# Altium schematic symbol library jlcpcb_2025_04_inductors_extended_0603.schlib: 1269 symbols (part 7 of 7)
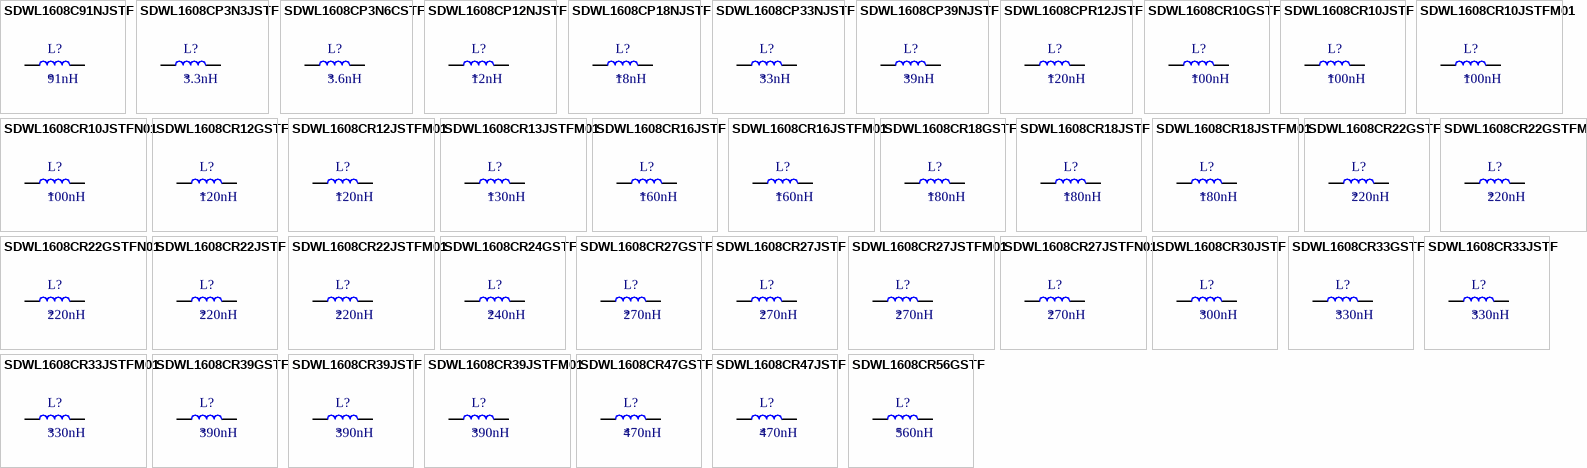
[diagram p37: symbols SDWL1608C91NJSTF to SDWL1608CR56GSTF]

## SDWL1608CR18JSTF
designator L?  Inductance: 180nH
Inductor, 180nH, ±5%, 1.38Ω, 180mA, SMD 0603; Manufacturer: Sunlord; Manufacturer Part Number: SDWL1608CR18JSTF; Package Size: 0603; JLCPCB Basic Part: No; JLCPCB Part Number: C334269; Supplier 1: LCSC; Category: Inductors; Supplier Part Number 1: C334269; Tolerance: ±5%; Rated Current: 180mA; DC Resistance: 1.38Ω; RoHS: Yes; ComponentLink1Description: Datasheet; ComponentLink1URL: https://wmsc.lcsc.com/wmsc/upload/file/pdf/v2/lcsc/2110081430_Sunlord-SDWL1608CR18JSTF_C334269.pdf; ComponentLink2Description: JLCPCB Part URL; ComponentLink2URL: https://jlcpcb.com/partdetail/C334269; ComponentLink3Description: LCSC Part URL; ComponentLink3URL: https://lcsc.com/product-detail/Inductors-SMD_Sunlord-Sunlord-SDWL1608CR18JSTF_C334269.html
footprint IND-0603 (0603 (1608M) Inductor)
pins: 1, 2

## SDWL1608CR18JSTFM01
designator L?  Inductance: 180nH
Inductor, 180nH, ±5%, 2.2Ω, 140mA, SMD 0603; Manufacturer: Sunlord; Manufacturer Part Number: SDWL1608CR18JSTFM01; Self-Resonant Frequency: 100MHz; Q Factor: 25@100MHz; Package Size: 0603; JLCPCB Basic Part: No; JLCPCB Part Number: C408756; Supplier 1: LCSC; Category: Inductors; Supplier Part Number 1: C408756; Tolerance: ±5%; Rated Current: 140mA; DC Resistance: 2.2Ω; RoHS: Yes; ComponentLink1Description: Datasheet; ComponentLink1URL: https://wmsc.lcsc.com/wmsc/upload/file/pdf/v2/lcsc/2110081530_Sunlord-SDWL1608CR18JSTFM01_C408756.pdf; ComponentLink2Description: JLCPCB Part URL; ComponentLink2URL: https://jlcpcb.com/partdetail/C408756; ComponentLink3Description: LCSC Part URL; ComponentLink3URL: https://lcsc.com/product-detail/Inductors-SMD_Sunlord-Sunlord-SDWL1608CR18JSTFM01_C408756.html
footprint IND-0603 (0603 (1608M) Inductor)
pins: 1, 2

## SDWL1608CR22GSTF
designator L?  Inductance: 220nH
Inductor, 220nH, ±2%, 2.1Ω, 140mA, SMD 0603; Manufacturer: Sunlord; Manufacturer Part Number: SDWL1608CR22GSTF; Package Size: 0603; JLCPCB Basic Part: No; JLCPCB Part Number: C370366; Supplier 1: LCSC; Category: Inductors; Supplier Part Number 1: C370366; Tolerance: ±2%; Rated Current: 140mA; DC Resistance: 2.1Ω; RoHS: Yes; ComponentLink1Description: Datasheet; ComponentLink1URL: https://wmsc.lcsc.com/wmsc/upload/file/pdf/v2/lcsc/2110081530_Sunlord-SDWL1608CR22GSTF_C370366.pdf; ComponentLink2Description: JLCPCB Part URL; ComponentLink2URL: https://jlcpcb.com/partdetail/C370366; ComponentLink3Description: LCSC Part URL; ComponentLink3URL: https://lcsc.com/product-detail/Inductors-SMD_Sunlord-Sunlord-SDWL1608CR22GSTF_C370366.html
footprint IND-0603 (0603 (1608M) Inductor)
pins: 1, 2

## SDWL1608CR22GSTFM01
designator L?  Inductance: 220nH
Inductor, 220nH, ±2%, 2.1Ω, 120mA, SMD 0603; Manufacturer: Sunlord; Manufacturer Part Number: SDWL1608CR22GSTFM01; Self-Resonant Frequency: 1.2GHz; Q Factor: 25@100MHz; Package Size: 0603; JLCPCB Basic Part: No; JLCPCB Part Number: C64699; Supplier 1: LCSC; Category: Inductors; Supplier Part Number 1: C64699; Tolerance: ±2%; Rated Current: 120mA; DC Resistance: 2.1Ω; RoHS: Yes; ComponentLink1Description: Datasheet; ComponentLink1URL: https://wmsc.lcsc.com/wmsc/upload/file/pdf/v2/lcsc/2110081230_Sunlord-SDWL1608CR22GSTFM01_C64699.pdf; ComponentLink2Description: JLCPCB Part URL; ComponentLink2URL: https://jlcpcb.com/partdetail/C64699; ComponentLink3Description: LCSC Part URL; ComponentLink3URL: https://lcsc.com/product-detail/Inductors-SMD_Sunlord-Sunlord-SDWL1608CR22GSTFM01_C64699.html
footprint IND-0603 (0603 (1608M) Inductor)
pins: 1, 2

## SDWL1608CR22GSTFN01
designator L?  Inductance: 220nH
Inductor, 220nH, ±2%, SMD 0603; Manufacturer: Sunlord; Manufacturer Part Number: SDWL1608CR22GSTFN01; Package Size: 0603; JLCPCB Basic Part: No; JLCPCB Part Number: C2988106; Supplier 1: LCSC; Category: Inductors; Supplier Part Number 1: C2988106; Tolerance: ±2%; RoHS: Yes; ComponentLink1Description: Datasheet; ComponentLink1URL: https://wmsc.lcsc.com/wmsc/upload/file/pdf/v2/lcsc/2204021230_Sunlord-SDWL1608CR22GSTFN01_C2988106.pdf; ComponentLink2Description: JLCPCB Part URL; ComponentLink2URL: https://jlcpcb.com/partdetail/C2988106; ComponentLink3Description: LCSC Part URL; ComponentLink3URL: https://lcsc.com/product-detail/Inductors-SMD_Sunlord-Sunlord-SDWL1608CR22GSTFN01_C2988106.html
footprint IND-0603 (0603 (1608M) Inductor)
pins: 1, 2

## SDWL1608CR22JSTF
designator L?  Inductance: 220nH
Inductor, 220nH, ±5%, 2.1Ω, 140mA, SMD 0603; Manufacturer: Sunlord; Manufacturer Part Number: SDWL1608CR22JSTF; Package Size: 0603; JLCPCB Basic Part: No; JLCPCB Part Number: C316371; Supplier 1: LCSC; Category: Inductors; Supplier Part Number 1: C316371; Tolerance: ±5%; Rated Current: 140mA; DC Resistance: 2.1Ω; RoHS: Yes; ComponentLink1Description: Datasheet; ComponentLink1URL: https://wmsc.lcsc.com/wmsc/upload/file/pdf/v2/lcsc/2110081430_Sunlord-SDWL1608CR22JSTF_C316371.pdf; ComponentLink2Description: JLCPCB Part URL; ComponentLink2URL: https://jlcpcb.com/partdetail/C316371; ComponentLink3Description: LCSC Part URL; ComponentLink3URL: https://lcsc.com/product-detail/Inductors-SMD_Sunlord-Sunlord-SDWL1608CR22JSTF_C316371.html
footprint IND-0603 (0603 (1608M) Inductor)
pins: 1, 2

## SDWL1608CR22JSTFM01
designator L?  Inductance: 220nH
Inductor, 220nH, ±5%, 2.5Ω, 120mA, SMD 0603; Manufacturer: Sunlord; Manufacturer Part Number: SDWL1608CR22JSTFM01; Self-Resonant Frequency: 100MHz; Q Factor: 25@100MHz; Package Size: 0603; JLCPCB Basic Part: No; JLCPCB Part Number: C408758; Supplier 1: LCSC; Category: Inductors; Supplier Part Number 1: C408758; Tolerance: ±5%; Rated Current: 120mA; DC Resistance: 2.5Ω; RoHS: Yes; ComponentLink1Description: Datasheet; ComponentLink1URL: https://wmsc.lcsc.com/wmsc/upload/file/pdf/v2/lcsc/2110081530_Sunlord-SDWL1608CR22JSTFM01_C408758.pdf; ComponentLink2Description: JLCPCB Part URL; ComponentLink2URL: https://jlcpcb.com/partdetail/C408758; ComponentLink3Description: LCSC Part URL; ComponentLink3URL: https://lcsc.com/product-detail/Inductors-SMD_Sunlord-Sunlord-SDWL1608CR22JSTFM01_C408758.html
footprint IND-0603 (0603 (1608M) Inductor)
pins: 1, 2

## SDWL1608CR24GSTF
designator L?  Inductance: 240nH
Inductor, 240nH, ±2%, 2.75Ω, 120mA, SMD 0603; Manufacturer: Sunlord; Manufacturer Part Number: SDWL1608CR24GSTF; Package Size: 0603; JLCPCB Basic Part: No; JLCPCB Part Number: C370367; Supplier 1: LCSC; Category: Inductors; Supplier Part Number 1: C370367; Tolerance: ±2%; Rated Current: 120mA; DC Resistance: 2.75Ω; RoHS: Yes; ComponentLink1Description: Datasheet; ComponentLink1URL: https://wmsc.lcsc.com/wmsc/upload/file/pdf/v2/lcsc/2110081530_Sunlord-SDWL1608CR24GSTF_C370367.pdf; ComponentLink2Description: JLCPCB Part URL; ComponentLink2URL: https://jlcpcb.com/partdetail/C370367; ComponentLink3Description: LCSC Part URL; ComponentLink3URL: https://lcsc.com/product-detail/Inductors-SMD_Sunlord-Sunlord-SDWL1608CR24GSTF_C370367.html
footprint IND-0603 (0603 (1608M) Inductor)
pins: 1, 2

## SDWL1608CR27GSTF
designator L?  Inductance: 270nH
Inductor, 270nH, ±2%, 3Ω, 120mA, SMD 0603; Manufacturer: Sunlord; Manufacturer Part Number: SDWL1608CR27GSTF; Package Size: 0603; JLCPCB Basic Part: No; JLCPCB Part Number: C370368; Supplier 1: LCSC; Category: Inductors; Supplier Part Number 1: C370368; Tolerance: ±2%; Rated Current: 120mA; DC Resistance: 3Ω; RoHS: Yes; ComponentLink1Description: Datasheet; ComponentLink1URL: https://wmsc.lcsc.com/wmsc/upload/file/pdf/v2/lcsc/2110081530_Sunlord-SDWL1608CR27GSTF_C370368.pdf; ComponentLink2Description: JLCPCB Part URL; ComponentLink2URL: https://jlcpcb.com/partdetail/C370368; ComponentLink3Description: LCSC Part URL; ComponentLink3URL: https://lcsc.com/product-detail/Inductors-SMD_Sunlord-Sunlord-SDWL1608CR27GSTF_C370368.html
footprint IND-0603 (0603 (1608M) Inductor)
pins: 1, 2

## SDWL1608CR27JSTF
designator L?  Inductance: 270nH
Inductor, 270nH, ±5%, 3Ω, 120mA, SMD 0603; Manufacturer: Sunlord; Manufacturer Part Number: SDWL1608CR27JSTF; Package Size: 0603; JLCPCB Basic Part: No; JLCPCB Part Number: C78154; Supplier 1: LCSC; Category: Inductors; Supplier Part Number 1: C78154; Tolerance: ±5%; Rated Current: 120mA; DC Resistance: 3Ω; RoHS: Yes; ComponentLink1Description: Datasheet; ComponentLink1URL: https://wmsc.lcsc.com/wmsc/upload/file/pdf/v2/lcsc/2110081230_Sunlord-SDWL1608CR27JSTF_C78154.pdf; ComponentLink2Description: JLCPCB Part URL; ComponentLink2URL: https://jlcpcb.com/partdetail/C78154; ComponentLink3Description: LCSC Part URL; ComponentLink3URL: https://lcsc.com/product-detail/Inductors-SMD_Sunlord-Sunlord-SDWL1608CR27JSTF_C78154.html
footprint IND-0603 (0603 (1608M) Inductor)
pins: 1, 2

## SDWL1608CR27JSTFM01
designator L?  Inductance: 270nH
Inductor, 270nH, ±5%, 3.4Ω, 110mA, SMD 0603; Manufacturer: Sunlord; Manufacturer Part Number: SDWL1608CR27JSTFM01; Self-Resonant Frequency: 100MHz; Q Factor: 30@100MHz; Package Size: 0603; JLCPCB Basic Part: No; JLCPCB Part Number: C408759; Supplier 1: LCSC; Category: Inductors; Supplier Part Number 1: C408759; Tolerance: ±5%; Rated Current: 110mA; DC Resistance: 3.4Ω; RoHS: Yes; ComponentLink1Description: Datasheet; ComponentLink1URL: https://wmsc.lcsc.com/wmsc/upload/file/pdf/v2/lcsc/2110081530_Sunlord-SDWL1608CR27JSTFM01_C408759.pdf; ComponentLink2Description: JLCPCB Part URL; ComponentLink2URL: https://jlcpcb.com/partdetail/C408759; ComponentLink3Description: LCSC Part URL; ComponentLink3URL: https://lcsc.com/product-detail/Inductors-SMD_Sunlord-Sunlord-SDWL1608CR27JSTFM01_C408759.html
footprint IND-0603 (0603 (1608M) Inductor)
pins: 1, 2

## SDWL1608CR27JSTFN01
designator L?  Inductance: 270nH
Inductor, 270nH, ±5%, SMD 0603; Manufacturer: Sunlord; Manufacturer Part Number: SDWL1608CR27JSTFN01; Package Size: 0603; JLCPCB Basic Part: No; JLCPCB Part Number: C370369; Supplier 1: LCSC; Category: Inductors; Supplier Part Number 1: C370369; Tolerance: ±5%; RoHS: Yes; ComponentLink1Description: Datasheet; ComponentLink2Description: JLCPCB Part URL; ComponentLink2URL: https://jlcpcb.com/partdetail/C370369; ComponentLink3Description: LCSC Part URL; ComponentLink3URL: https://lcsc.com/product-detail/Inductors-SMD_Sunlord-Sunlord-SDWL1608CR27JSTFN01_C370369.html
footprint IND-0603 (0603 (1608M) Inductor)
pins: 1, 2

## SDWL1608CR30JSTF
designator L?  Inductance: 300nH
Inductor, 300nH, ±5%, 4.05Ω, 110mA, SMD 0603; Manufacturer: Sunlord; Manufacturer Part Number: SDWL1608CR30JSTF; Package Size: 0603; JLCPCB Basic Part: No; JLCPCB Part Number: C370371; Supplier 1: LCSC; Category: Inductors; Supplier Part Number 1: C370371; Tolerance: ±5%; Rated Current: 110mA; DC Resistance: 4.05Ω; RoHS: Yes; ComponentLink1Description: Datasheet; ComponentLink1URL: https://wmsc.lcsc.com/wmsc/upload/file/pdf/v2/lcsc/2110081530_Sunlord-SDWL1608CR30JSTF_C370371.pdf; ComponentLink2Description: JLCPCB Part URL; ComponentLink2URL: https://jlcpcb.com/partdetail/C370371; ComponentLink3Description: LCSC Part URL; ComponentLink3URL: https://lcsc.com/product-detail/Inductors-SMD_Sunlord-Sunlord-SDWL1608CR30JSTF_C370371.html
footprint IND-0603 (0603 (1608M) Inductor)
pins: 1, 2

## SDWL1608CR33GSTF
designator L?  Inductance: 330nH
Inductor, 330nH, ±2%, 4.2Ω, 100mA, SMD 0603; Manufacturer: Sunlord; Manufacturer Part Number: SDWL1608CR33GSTF; Package Size: 0603; JLCPCB Basic Part: No; JLCPCB Part Number: C370372; Supplier 1: LCSC; Category: Inductors; Supplier Part Number 1: C370372; Tolerance: ±2%; Rated Current: 100mA; DC Resistance: 4.2Ω; RoHS: Yes; ComponentLink1Description: Datasheet; ComponentLink1URL: https://wmsc.lcsc.com/wmsc/upload/file/pdf/v2/lcsc/2110081530_Sunlord-SDWL1608CR33GSTF_C370372.pdf; ComponentLink2Description: JLCPCB Part URL; ComponentLink2URL: https://jlcpcb.com/partdetail/C370372; ComponentLink3Description: LCSC Part URL; ComponentLink3URL: https://lcsc.com/product-detail/Inductors-SMD_Sunlord-Sunlord-SDWL1608CR33GSTF_C370372.html
footprint IND-0603 (0603 (1608M) Inductor)
pins: 1, 2

## SDWL1608CR33JSTF
designator L?  Inductance: 330nH
Inductor, 330nH, ±5%, 4.2Ω, 100mA, SMD 0603; Manufacturer: Sunlord; Manufacturer Part Number: SDWL1608CR33JSTF; Package Size: 0603; JLCPCB Basic Part: No; JLCPCB Part Number: C98206; Supplier 1: LCSC; Category: Inductors; Supplier Part Number 1: C98206; Tolerance: ±5%; Rated Current: 100mA; DC Resistance: 4.2Ω; RoHS: Yes; ComponentLink1Description: Datasheet; ComponentLink1URL: https://wmsc.lcsc.com/wmsc/upload/file/pdf/v2/lcsc/2110081230_Sunlord-SDWL1608CR33JSTF_C98206.pdf; ComponentLink2Description: JLCPCB Part URL; ComponentLink2URL: https://jlcpcb.com/partdetail/C98206; ComponentLink3Description: LCSC Part URL; ComponentLink3URL: https://lcsc.com/product-detail/Inductors-SMD_Sunlord-Sunlord-SDWL1608CR33JSTF_C98206.html
footprint IND-0603 (0603 (1608M) Inductor)
pins: 1, 2

## SDWL1608CR33JSTFM01
designator L?  Inductance: 330nH
Inductor, 330nH, ±5%, 5.5Ω, 85mA, SMD 0603; Manufacturer: Sunlord; Manufacturer Part Number: SDWL1608CR33JSTFM01; Self-Resonant Frequency: 100MHz; Q Factor: 30@100MHz; Package Size: 0603; JLCPCB Basic Part: No; JLCPCB Part Number: C408760; Supplier 1: LCSC; Category: Inductors; Supplier Part Number 1: C408760; Tolerance: ±5%; Rated Current: 85mA; DC Resistance: 5.5Ω; RoHS: Yes; ComponentLink1Description: Datasheet; ComponentLink1URL: https://wmsc.lcsc.com/wmsc/upload/file/pdf/v2/lcsc/2110081530_Sunlord-SDWL1608CR33JSTFM01_C408760.pdf; ComponentLink2Description: JLCPCB Part URL; ComponentLink2URL: https://jlcpcb.com/partdetail/C408760; ComponentLink3Description: LCSC Part URL; ComponentLink3URL: https://lcsc.com/product-detail/Inductors-SMD_Sunlord-Sunlord-SDWL1608CR33JSTFM01_C408760.html
footprint IND-0603 (0603 (1608M) Inductor)
pins: 1, 2

## SDWL1608CR39GSTF
designator L?  Inductance: 390nH
Inductor, 390nH, ±2%, 4.5Ω, 100mA, SMD 0603; Manufacturer: Sunlord; Manufacturer Part Number: SDWL1608CR39GSTF; Package Size: 0603; JLCPCB Basic Part: No; JLCPCB Part Number: C370373; Supplier 1: LCSC; Category: Inductors; Supplier Part Number 1: C370373; Tolerance: ±2%; Rated Current: 100mA; DC Resistance: 4.5Ω; RoHS: Yes; ComponentLink1Description: Datasheet; ComponentLink1URL: https://wmsc.lcsc.com/wmsc/upload/file/pdf/v2/lcsc/2110081530_Sunlord-SDWL1608CR39GSTF_C370373.pdf; ComponentLink2Description: JLCPCB Part URL; ComponentLink2URL: https://jlcpcb.com/partdetail/C370373; ComponentLink3Description: LCSC Part URL; ComponentLink3URL: https://lcsc.com/product-detail/Inductors-SMD_Sunlord-Sunlord-SDWL1608CR39GSTF_C370373.html
footprint IND-0603 (0603 (1608M) Inductor)
pins: 1, 2

## SDWL1608CR39JSTF
designator L?  Inductance: 390nH
Inductor, 390nH, ±5%, 4.5Ω, 100mA, SMD 0603; Manufacturer: Sunlord; Manufacturer Part Number: SDWL1608CR39JSTF; Package Size: 0603; JLCPCB Basic Part: No; JLCPCB Part Number: C98207; Supplier 1: LCSC; Category: Inductors; Supplier Part Number 1: C98207; Tolerance: ±5%; Rated Current: 100mA; DC Resistance: 4.5Ω; RoHS: Yes; ComponentLink1Description: Datasheet; ComponentLink1URL: https://wmsc.lcsc.com/wmsc/upload/file/pdf/v2/lcsc/2110081230_Sunlord-SDWL1608CR39JSTF_C98207.pdf; ComponentLink2Description: JLCPCB Part URL; ComponentLink2URL: https://jlcpcb.com/partdetail/C98207; ComponentLink3Description: LCSC Part URL; ComponentLink3URL: https://lcsc.com/product-detail/Inductors-SMD_Sunlord-Sunlord-SDWL1608CR39JSTF_C98207.html
footprint IND-0603 (0603 (1608M) Inductor)
pins: 1, 2

## SDWL1608CR39JSTFM01
designator L?  Inductance: 390nH
Inductor, 390nH, ±5%, 6.2Ω, 80mA, SMD 0603; Manufacturer: Sunlord; Manufacturer Part Number: SDWL1608CR39JSTFM01; Self-Resonant Frequency: 100MHz; Q Factor: 30@100MHz; Package Size: 0603; JLCPCB Basic Part: No; JLCPCB Part Number: C408761; Supplier 1: LCSC; Category: Inductors; Supplier Part Number 1: C408761; Tolerance: ±5%; Rated Current: 80mA; DC Resistance: 6.2Ω; RoHS: Yes; ComponentLink1Description: Datasheet; ComponentLink1URL: https://wmsc.lcsc.com/wmsc/upload/file/pdf/v2/lcsc/2110081530_Sunlord-SDWL1608CR39JSTFM01_C408761.pdf; ComponentLink2Description: JLCPCB Part URL; ComponentLink2URL: https://jlcpcb.com/partdetail/C408761; ComponentLink3Description: LCSC Part URL; ComponentLink3URL: https://lcsc.com/product-detail/Inductors-SMD_Sunlord-Sunlord-SDWL1608CR39JSTFM01_C408761.html
footprint IND-0603 (0603 (1608M) Inductor)
pins: 1, 2

## SDWL1608CR47GSTF
designator L?  Inductance: 470nH
Inductor, 470nH, ±2%, 5.7Ω, 90mA, SMD 0603; Manufacturer: Sunlord; Manufacturer Part Number: SDWL1608CR47GSTF; Package Size: 0603; JLCPCB Basic Part: No; JLCPCB Part Number: C370374; Supplier 1: LCSC; Category: Inductors; Supplier Part Number 1: C370374; Tolerance: ±2%; Rated Current: 90mA; DC Resistance: 5.7Ω; RoHS: Yes; ComponentLink1Description: Datasheet; ComponentLink1URL: https://wmsc.lcsc.com/wmsc/upload/file/pdf/v2/lcsc/2110081530_Sunlord-SDWL1608CR47GSTF_C370374.pdf; ComponentLink2Description: JLCPCB Part URL; ComponentLink2URL: https://jlcpcb.com/partdetail/C370374; ComponentLink3Description: LCSC Part URL; ComponentLink3URL: https://lcsc.com/product-detail/Inductors-SMD_Sunlord-Sunlord-SDWL1608CR47GSTF_C370374.html
footprint IND-0603 (0603 (1608M) Inductor)
pins: 1, 2

## SDWL1608CR47JSTF
designator L?  Inductance: 470nH
Inductor, 470nH, ±5%, 5.7Ω, 90mA, SMD 0603; Manufacturer: Sunlord; Manufacturer Part Number: SDWL1608CR47JSTF; Package Size: 0603; JLCPCB Basic Part: No; JLCPCB Part Number: C98208; Supplier 1: LCSC; Category: Inductors; Supplier Part Number 1: C98208; Tolerance: ±5%; Rated Current: 90mA; DC Resistance: 5.7Ω; RoHS: Yes; ComponentLink1Description: Datasheet; ComponentLink1URL: https://wmsc.lcsc.com/wmsc/upload/file/pdf/v2/lcsc/2110081230_Sunlord-SDWL1608CR47JSTF_C98208.pdf; ComponentLink2Description: JLCPCB Part URL; ComponentLink2URL: https://jlcpcb.com/partdetail/C98208; ComponentLink3Description: LCSC Part URL; ComponentLink3URL: https://lcsc.com/product-detail/Inductors-SMD_Sunlord-Sunlord-SDWL1608CR47JSTF_C98208.html
footprint IND-0603 (0603 (1608M) Inductor)
pins: 1, 2

## SDWL1608CR56GSTF
designator L?  Inductance: 560nH
Inductor, 560nH, ±2%, 8.1Ω, 70mA, SMD 0603; Manufacturer: Sunlord; Manufacturer Part Number: SDWL1608CR56GSTF; Package Size: 0603; JLCPCB Basic Part: No; JLCPCB Part Number: C370375; Supplier 1: LCSC; Category: Inductors; Supplier Part Number 1: C370375; Tolerance: ±2%; Rated Current: 70mA; DC Resistance: 8.1Ω; RoHS: Yes; ComponentLink1Description: Datasheet; ComponentLink1URL: https://wmsc.lcsc.com/wmsc/upload/file/pdf/v2/lcsc/2110081530_Sunlord-SDWL1608CR56GSTF_C370375.pdf; ComponentLink2Description: JLCPCB Part URL; ComponentLink2URL: https://jlcpcb.com/partdetail/C370375; ComponentLink3Description: LCSC Part URL; ComponentLink3URL: https://lcsc.com/product-detail/Inductors-SMD_Sunlord-Sunlord-SDWL1608CR56GSTF_C370375.html
footprint IND-0603 (0603 (1608M) Inductor)
pins: 1, 2

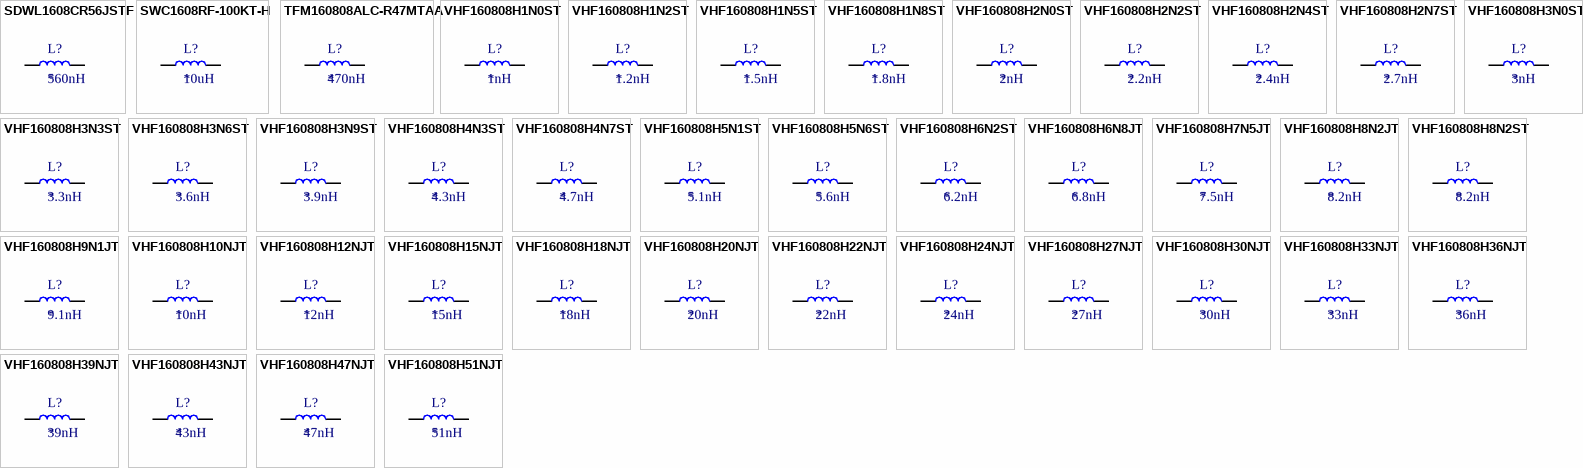
[diagram p30: symbols SDWL1608CR56JSTF to VHF160808H51NJT]

## SDWL1608CR56JSTF
designator L?  Inductance: 560nH
Inductor, 560nH, ±5%, 8.1Ω, 70mA, SMD 0603; Manufacturer: Sunlord; Manufacturer Part Number: SDWL1608CR56JSTF; Package Size: 0603; JLCPCB Basic Part: No; JLCPCB Part Number: C279901; Supplier 1: LCSC; Category: Inductors; Supplier Part Number 1: C279901; Tolerance: ±5%; Rated Current: 70mA; DC Resistance: 8.1Ω; RoHS: Yes; ComponentLink1Description: Datasheet; ComponentLink1URL: https://wmsc.lcsc.com/wmsc/upload/file/pdf/v2/lcsc/2110081430_Sunlord-SDWL1608CR56JSTF_C279901.pdf; ComponentLink2Description: JLCPCB Part URL; ComponentLink2URL: https://jlcpcb.com/partdetail/C279901; ComponentLink3Description: LCSC Part URL; ComponentLink3URL: https://lcsc.com/product-detail/Inductors-SMD_Sunlord-Sunlord-SDWL1608CR56JSTF_C279901.html
footprint IND-0603 (0603 (1608M) Inductor)
pins: 1, 2

## SWC1608RF-100KT-H
designator L?  Inductance: 10uH
Inductor, 10uH, ±10%, 1.85Ω, 280mA, SMD 0603; Manufacturer: TAI-TECH; Manufacturer Part Number: SWC1608RF-100KT-H; Package Size: 0603; JLCPCB Basic Part: No; JLCPCB Part Number: C525681; Supplier 1: LCSC; Category: Inductors; Supplier Part Number 1: C525681; Tolerance: ±10%; Rated Current: 280mA; DC Resistance: 1.85Ω; RoHS: Yes; ComponentLink1Description: Datasheet; ComponentLink1URL: https://wmsc.lcsc.com/wmsc/upload/file/pdf/v2/lcsc/2009171443_TAI-TECH-SWC1608RF-100KT-H_C525681.pdf; ComponentLink2Description: JLCPCB Part URL; ComponentLink2URL: https://jlcpcb.com/partdetail/C525681; ComponentLink3Description: LCSC Part URL; ComponentLink3URL: https://lcsc.com/product-detail/Inductors-SMD_TAI-TECH-TAI-TECH-SWC1608RF-100KT-H_C525681.html
footprint IND-0603 (0603 (1608M) Inductor)
pins: 1, 2

## TFM160808ALC-R47MTAA
designator L?  Inductance: 470nH
Inductor, 470nH, ±20%, 54mΩ, 2.6A, SMD 0603; Manufacturer: TDK; Manufacturer Part Number: TFM160808ALC-R47MTAA; Saturation Current: 2.9A; Package Size: 0603; JLCPCB Basic Part: No; JLCPCB Part Number: C695609; Supplier 1: LCSC; Category: Inductors; Supplier Part Number 1: C695609; Tolerance: ±20%; Rated Current: 2.6A; DC Resistance: 54mΩ; RoHS: Yes; ComponentLink1Description: Datasheet; ComponentLink1URL: https://wmsc.lcsc.com/wmsc/upload/file/pdf/v2/lcsc/2007071236_TDK-TFM160808ALC-R47MTAA_C695609.pdf; ComponentLink2Description: JLCPCB Part URL; ComponentLink2URL: https://jlcpcb.com/partdetail/C695609; ComponentLink3Description: LCSC Part URL; ComponentLink3URL: https://lcsc.com/product-detail/Inductors-SMD_TDK-TDK-TFM160808ALC-R47MTAA_C695609.html
footprint IND-0603 (0603 (1608M) Inductor)
pins: 1, 2

## VHF160808H1N0ST
designator L?  Inductance: 1nH
Inductor, 1nH, 50mΩ, 500mA, SMD 0603; Manufacturer: FH(Guangdong Fenghua Advanced Tech); Manufacturer Part Number: VHF160808H1N0ST; Package Size: 0603; JLCPCB Basic Part: No; JLCPCB Part Number: C1027; Supplier 1: LCSC; Category: Inductors; Supplier Part Number 1: C1027; Rated Current: 500mA; DC Resistance: 50mΩ; RoHS: Yes; ComponentLink1Description: Datasheet; ComponentLink1URL: https://wmsc.lcsc.com/wmsc/upload/file/pdf/v2/lcsc/2302231101_FH--Guangdong-Fenghua-Advanced-Tech-VHF160808H1N0ST_C1027.pdf; ComponentLink2Description: JLCPCB Part URL; ComponentLink2URL: https://jlcpcb.com/partdetail/C1027; ComponentLink3Description: LCSC Part URL; ComponentLink3URL: https://lcsc.com/product-detail/Inductors-SMD_FH-Guangdong-Fenghua-Advanced-Tech-FH-Guangdong-Fenghua-Advanced-Tech-VHF160808H1N0ST_C1027.html
footprint IND-0603 (0603 (1608M) Inductor)
pins: 1, 2

## VHF160808H1N2ST
designator L?  Inductance: 1.2nH
Inductor, 1.2nH, 100mΩ, 500mA, SMD 0603; Manufacturer: FH(Guangdong Fenghua Advanced Tech); Manufacturer Part Number: VHF160808H1N2ST; Package Size: 0603; JLCPCB Basic Part: No; JLCPCB Part Number: C90200; Supplier 1: LCSC; Category: Inductors; Supplier Part Number 1: C90200; Rated Current: 500mA; DC Resistance: 100mΩ; RoHS: Yes; ComponentLink1Description: Datasheet; ComponentLink1URL: https://wmsc.lcsc.com/wmsc/upload/file/pdf/v2/lcsc/2302231230_FH--Guangdong-Fenghua-Advanced-Tech-VHF160808H1N2ST_C90200.pdf; ComponentLink2Description: JLCPCB Part URL; ComponentLink2URL: https://jlcpcb.com/partdetail/C90200; ComponentLink3Description: LCSC Part URL; ComponentLink3URL: https://lcsc.com/product-detail/Inductors-SMD_FH-Guangdong-Fenghua-Advanced-Tech-FH-Guangdong-Fenghua-Advanced-Tech-VHF160808H1N2ST_C90200.html
footprint IND-0603 (0603 (1608M) Inductor)
pins: 1, 2

## VHF160808H1N5ST
designator L?  Inductance: 1.5nH
Inductor, 1.5nH, 100mΩ, 400mA, SMD 0603; Manufacturer: FH(Guangdong Fenghua Advanced Tech); Manufacturer Part Number: VHF160808H1N5ST; Package Size: 0603; JLCPCB Basic Part: No; JLCPCB Part Number: C90201; Supplier 1: LCSC; Category: Inductors; Supplier Part Number 1: C90201; Rated Current: 400mA; DC Resistance: 100mΩ; RoHS: Yes; ComponentLink1Description: Datasheet; ComponentLink1URL: https://wmsc.lcsc.com/wmsc/upload/file/pdf/v2/lcsc/2302231230_FH--Guangdong-Fenghua-Advanced-Tech-VHF160808H1N5ST_C90201.pdf; ComponentLink2Description: JLCPCB Part URL; ComponentLink2URL: https://jlcpcb.com/partdetail/C90201; ComponentLink3Description: LCSC Part URL; ComponentLink3URL: https://lcsc.com/product-detail/Inductors-SMD_FH-Guangdong-Fenghua-Advanced-Tech-FH-Guangdong-Fenghua-Advanced-Tech-VHF160808H1N5ST_C90201.html
footprint IND-0603 (0603 (1608M) Inductor)
pins: 1, 2

## VHF160808H1N8ST
designator L?  Inductance: 1.8nH
Inductor, 1.8nH, 120mΩ, 400mA, SMD 0603; Manufacturer: FH(Guangdong Fenghua Advanced Tech); Manufacturer Part Number: VHF160808H1N8ST; Package Size: 0603; JLCPCB Basic Part: No; JLCPCB Part Number: C1026; Supplier 1: LCSC; Category: Inductors; Supplier Part Number 1: C1026; Rated Current: 400mA; DC Resistance: 120mΩ; RoHS: Yes; ComponentLink1Description: Datasheet; ComponentLink1URL: https://wmsc.lcsc.com/wmsc/upload/file/pdf/v2/lcsc/2302231101_FH--Guangdong-Fenghua-Advanced-Tech-VHF160808H1N8ST_C1026.pdf; ComponentLink2Description: JLCPCB Part URL; ComponentLink2URL: https://jlcpcb.com/partdetail/C1026; ComponentLink3Description: LCSC Part URL; ComponentLink3URL: https://lcsc.com/product-detail/Inductors-SMD_FH-Guangdong-Fenghua-Advanced-Tech-FH-Guangdong-Fenghua-Advanced-Tech-VHF160808H1N8ST_C1026.html
footprint IND-0603 (0603 (1608M) Inductor)
pins: 1, 2

## VHF160808H2N0ST
designator L?  Inductance: 2nH
Inductor, 2nH, SMD 0603; Manufacturer: FH(Guangdong Fenghua Advanced Tech); Manufacturer Part Number: VHF160808H2N0ST; Package Size: 0603; JLCPCB Basic Part: No; JLCPCB Part Number: C395081; Supplier 1: LCSC; Category: Inductors; Supplier Part Number 1: C395081; RoHS: Yes; ComponentLink1Description: Datasheet; ComponentLink1URL: https://wmsc.lcsc.com/wmsc/upload/file/pdf/v2/lcsc/2302231208_FH--Guangdong-Fenghua-Advanced-Tech-VHF160808H2N0ST_C395081.pdf; ComponentLink2Description: JLCPCB Part URL; ComponentLink2URL: https://jlcpcb.com/partdetail/C395081; ComponentLink3Description: LCSC Part URL; ComponentLink3URL: https://lcsc.com/product-detail/Inductors-SMD_FH-Guangdong-Fenghua-Advanced-Tech-FH-Guangdong-Fenghua-Advanced-Tech-VHF160808H2N0ST_C395081.html
footprint IND-0603 (0603 (1608M) Inductor)
pins: 1, 2

## VHF160808H2N2ST
designator L?  Inductance: 2.2nH
Inductor, 2.2nH, 200mΩ, 400mA, SMD 0603; Manufacturer: FH(Guangdong Fenghua Advanced Tech); Manufacturer Part Number: VHF160808H2N2ST; Package Size: 0603; JLCPCB Basic Part: No; JLCPCB Part Number: C1028; Supplier 1: LCSC; Category: Inductors; Supplier Part Number 1: C1028; Rated Current: 400mA; DC Resistance: 200mΩ; RoHS: Yes; ComponentLink1Description: Datasheet; ComponentLink1URL: https://wmsc.lcsc.com/wmsc/upload/file/pdf/v2/lcsc/2302231101_FH--Guangdong-Fenghua-Advanced-Tech-VHF160808H2N2ST_C1028.pdf; ComponentLink2Description: JLCPCB Part URL; ComponentLink2URL: https://jlcpcb.com/partdetail/C1028; ComponentLink3Description: LCSC Part URL; ComponentLink3URL: https://lcsc.com/product-detail/Inductors-SMD_FH-Guangdong-Fenghua-Advanced-Tech-FH-Guangdong-Fenghua-Advanced-Tech-VHF160808H2N2ST_C1028.html
footprint IND-0603 (0603 (1608M) Inductor)
pins: 1, 2

## VHF160808H2N4ST
designator L?  Inductance: 2.4nH
Inductor, 2.4nH, 120mΩ, 500mA, SMD 0603; Manufacturer: FH(Guangdong Fenghua Advanced Tech); Manufacturer Part Number: VHF160808H2N4ST; Package Size: 0603; JLCPCB Basic Part: No; JLCPCB Part Number: C395082; Supplier 1: LCSC; Category: Inductors; Supplier Part Number 1: C395082; Rated Current: 500mA; DC Resistance: 120mΩ; RoHS: Yes; ComponentLink1Description: Datasheet; ComponentLink1URL: https://wmsc.lcsc.com/wmsc/upload/file/pdf/v2/lcsc/2302231208_FH--Guangdong-Fenghua-Advanced-Tech-VHF160808H2N4ST_C395082.pdf; ComponentLink2Description: JLCPCB Part URL; ComponentLink2URL: https://jlcpcb.com/partdetail/C395082; ComponentLink3Description: LCSC Part URL; ComponentLink3URL: https://lcsc.com/product-detail/Inductors-SMD_FH-Guangdong-Fenghua-Advanced-Tech-FH-Guangdong-Fenghua-Advanced-Tech-VHF160808H2N4ST_C395082.html
footprint IND-0603 (0603 (1608M) Inductor)
pins: 1, 2

## VHF160808H2N7ST
designator L?  Inductance: 2.7nH
Inductor, 2.7nH, 200mΩ, 400mA, SMD 0603; Manufacturer: FH(Guangdong Fenghua Advanced Tech); Manufacturer Part Number: VHF160808H2N7ST; Package Size: 0603; JLCPCB Basic Part: No; JLCPCB Part Number: C83929; Supplier 1: LCSC; Category: Inductors; Supplier Part Number 1: C83929; Rated Current: 400mA; DC Resistance: 200mΩ; RoHS: Yes; ComponentLink1Description: Datasheet; ComponentLink1URL: https://wmsc.lcsc.com/wmsc/upload/file/pdf/v2/lcsc/2302231230_FH--Guangdong-Fenghua-Advanced-Tech-VHF160808H2N7ST_C83929.pdf; ComponentLink2Description: JLCPCB Part URL; ComponentLink2URL: https://jlcpcb.com/partdetail/C83929; ComponentLink3Description: LCSC Part URL; ComponentLink3URL: https://lcsc.com/product-detail/Inductors-SMD_FH-Guangdong-Fenghua-Advanced-Tech-FH-Guangdong-Fenghua-Advanced-Tech-VHF160808H2N7ST_C83929.html
footprint IND-0603 (0603 (1608M) Inductor)
pins: 1, 2

## VHF160808H3N0ST
designator L?  Inductance: 3nH
Inductor, 3nH, 400mA, SMD 0603; Manufacturer: FH (Guangdong Fenghua Advanced Tech); Manufacturer Part Number: VHF160808H3N0ST; Package Size: 0603; JLCPCB Basic Part: No; JLCPCB Part Number: C395085; Supplier 1: LCSC; Category: Inductors; Supplier Part Number 1: C395085; Rated Current: 400mA; RoHS: Yes; ComponentLink1Description: Datasheet; ComponentLink1URL: https://wmsc.lcsc.com/wmsc/upload/file/pdf/v2/lcsc/2302231208_FH--Guangdong-Fenghua-Advanced-Tech-VHF160808H3N0ST_C395085.pdf; ComponentLink2Description: JLCPCB Part URL; ComponentLink2URL: https://jlcpcb.com/partdetail/C395085; ComponentLink3Description: LCSC Part URL; ComponentLink3URL: https://lcsc.com/product-detail/Inductors-SMD_FH-Guangdong-Fenghua-Advanced-Tech-FH-Guangdong-Fenghua-Advanced-Tech-VHF160808H3N0ST_C395085.html
footprint IND-0603 (0603 (1608M) Inductor)
pins: 1, 2

## VHF160808H3N3ST
designator L?  Inductance: 3.3nH
Inductor, 3.3nH, 200mΩ, 400mA, SMD 0603; Manufacturer: FH(Guangdong Fenghua Advanced Tech); Manufacturer Part Number: VHF160808H3N3ST; Package Size: 0603; JLCPCB Basic Part: No; JLCPCB Part Number: C1029; Supplier 1: LCSC; Category: Inductors; Supplier Part Number 1: C1029; Rated Current: 400mA; DC Resistance: 200mΩ; RoHS: Yes; ComponentLink1Description: Datasheet; ComponentLink1URL: https://wmsc.lcsc.com/wmsc/upload/file/pdf/v2/lcsc/2302231101_FH--Guangdong-Fenghua-Advanced-Tech-VHF160808H3N3ST_C1029.pdf; ComponentLink2Description: JLCPCB Part URL; ComponentLink2URL: https://jlcpcb.com/partdetail/C1029; ComponentLink3Description: LCSC Part URL; ComponentLink3URL: https://lcsc.com/product-detail/Inductors-SMD_FH-Guangdong-Fenghua-Advanced-Tech-FH-Guangdong-Fenghua-Advanced-Tech-VHF160808H3N3ST_C1029.html
footprint IND-0603 (0603 (1608M) Inductor)
pins: 1, 2

## VHF160808H3N6ST
designator L?  Inductance: 3.6nH
Inductor, 3.6nH, SMD 0603; Manufacturer: FH (Guangdong Fenghua Advanced Tech); Manufacturer Part Number: VHF160808H3N6ST; Package Size: 0603; JLCPCB Basic Part: No; JLCPCB Part Number: C395086; Supplier 1: LCSC; Category: Inductors; Supplier Part Number 1: C395086; RoHS: Yes; ComponentLink1Description: Datasheet; ComponentLink1URL: https://wmsc.lcsc.com/wmsc/upload/file/pdf/v2/lcsc/2302231208_FH--Guangdong-Fenghua-Advanced-Tech-VHF160808H3N6ST_C395086.pdf; ComponentLink2Description: JLCPCB Part URL; ComponentLink2URL: https://jlcpcb.com/partdetail/C395086; ComponentLink3Description: LCSC Part URL; ComponentLink3URL: https://lcsc.com/product-detail/Inductors-SMD_FH-Guangdong-Fenghua-Advanced-Tech-FH-Guangdong-Fenghua-Advanced-Tech-VHF160808H3N6ST_C395086.html
footprint IND-0603 (0603 (1608M) Inductor)
pins: 1, 2

## VHF160808H3N9ST
designator L?  Inductance: 3.9nH
Inductor, 3.9nH, 250mΩ, 400mA, SMD 0603; Manufacturer: FH(Guangdong Fenghua Advanced Tech); Manufacturer Part Number: VHF160808H3N9ST; Package Size: 0603; JLCPCB Basic Part: No; JLCPCB Part Number: C90202; Supplier 1: LCSC; Category: Inductors; Supplier Part Number 1: C90202; Rated Current: 400mA; DC Resistance: 250mΩ; RoHS: Yes; ComponentLink1Description: Datasheet; ComponentLink1URL: https://wmsc.lcsc.com/wmsc/upload/file/pdf/v2/lcsc/2302231230_FH--Guangdong-Fenghua-Advanced-Tech-VHF160808H3N9ST_C90202.pdf; ComponentLink2Description: JLCPCB Part URL; ComponentLink2URL: https://jlcpcb.com/partdetail/C90202; ComponentLink3Description: LCSC Part URL; ComponentLink3URL: https://lcsc.com/product-detail/Inductors-SMD_FH-Guangdong-Fenghua-Advanced-Tech-FH-Guangdong-Fenghua-Advanced-Tech-VHF160808H3N9ST_C90202.html
footprint IND-0603 (0603 (1608M) Inductor)
pins: 1, 2

## VHF160808H4N3ST
designator L?  Inductance: 4.3nH
Inductor, 4.3nH, 180mΩ, 500mA, SMD 0603; Manufacturer: FH(Guangdong Fenghua Advanced Tech); Manufacturer Part Number: VHF160808H4N3ST; Package Size: 0603; JLCPCB Basic Part: No; JLCPCB Part Number: C395088; Supplier 1: LCSC; Category: Inductors; Supplier Part Number 1: C395088; Rated Current: 500mA; DC Resistance: 180mΩ; RoHS: Yes; ComponentLink1Description: Datasheet; ComponentLink1URL: https://wmsc.lcsc.com/wmsc/upload/file/pdf/v2/lcsc/2302231208_FH--Guangdong-Fenghua-Advanced-Tech-VHF160808H4N3ST_C395088.pdf; ComponentLink2Description: JLCPCB Part URL; ComponentLink2URL: https://jlcpcb.com/partdetail/C395088; ComponentLink3Description: LCSC Part URL; ComponentLink3URL: https://lcsc.com/product-detail/Inductors-SMD_FH-Guangdong-Fenghua-Advanced-Tech-FH-Guangdong-Fenghua-Advanced-Tech-VHF160808H4N3ST_C395088.html
footprint IND-0603 (0603 (1608M) Inductor)
pins: 1, 2

## VHF160808H4N7ST
designator L?  Inductance: 4.7nH
Inductor, 4.7nH, 300mΩ, 400mA, SMD 0603; Manufacturer: FH(Guangdong Fenghua Advanced Tech); Manufacturer Part Number: VHF160808H4N7ST; Package Size: 0603; JLCPCB Basic Part: No; JLCPCB Part Number: C1030; Supplier 1: LCSC; Category: Inductors; Supplier Part Number 1: C1030; Rated Current: 400mA; DC Resistance: 300mΩ; RoHS: Yes; ComponentLink1Description: Datasheet; ComponentLink1URL: https://wmsc.lcsc.com/wmsc/upload/file/pdf/v2/lcsc/2302231101_FH--Guangdong-Fenghua-Advanced-Tech-VHF160808H4N7ST_C1030.pdf; ComponentLink2Description: JLCPCB Part URL; ComponentLink2URL: https://jlcpcb.com/partdetail/C1030; ComponentLink3Description: LCSC Part URL; ComponentLink3URL: https://lcsc.com/product-detail/Inductors-SMD_FH-Guangdong-Fenghua-Advanced-Tech-FH-Guangdong-Fenghua-Advanced-Tech-VHF160808H4N7ST_C1030.html
footprint IND-0603 (0603 (1608M) Inductor)
pins: 1, 2

## VHF160808H5N1ST
designator L?  Inductance: 5.1nH
Inductor, 5.1nH, SMD 0603; Manufacturer: FH (Guangdong Fenghua Advanced Tech); Manufacturer Part Number: VHF160808H5N1ST; Package Size: 0603; JLCPCB Basic Part: No; JLCPCB Part Number: C395089; Supplier 1: LCSC; Category: Inductors; Supplier Part Number 1: C395089; RoHS: Yes; ComponentLink1Description: Datasheet; ComponentLink1URL: https://wmsc.lcsc.com/wmsc/upload/file/pdf/v2/lcsc/2302231208_FH--Guangdong-Fenghua-Advanced-Tech-VHF160808H5N1ST_C395089.pdf; ComponentLink2Description: JLCPCB Part URL; ComponentLink2URL: https://jlcpcb.com/partdetail/C395089; ComponentLink3Description: LCSC Part URL; ComponentLink3URL: https://lcsc.com/product-detail/Inductors-SMD_FH-Guangdong-Fenghua-Advanced-Tech-FH-Guangdong-Fenghua-Advanced-Tech-VHF160808H5N1ST_C395089.html
footprint IND-0603 (0603 (1608M) Inductor)
pins: 1, 2

## VHF160808H5N6ST
designator L?  Inductance: 5.6nH
Inductor, 5.6nH, 300mΩ, 400mA, SMD 0603; Manufacturer: FH(Guangdong Fenghua Advanced Tech); Manufacturer Part Number: VHF160808H5N6ST; Package Size: 0603; JLCPCB Basic Part: No; JLCPCB Part Number: C1031; Supplier 1: LCSC; Category: Inductors; Supplier Part Number 1: C1031; Rated Current: 400mA; DC Resistance: 300mΩ; RoHS: Yes; ComponentLink1Description: Datasheet; ComponentLink1URL: https://wmsc.lcsc.com/wmsc/upload/file/pdf/v2/lcsc/2302231101_FH--Guangdong-Fenghua-Advanced-Tech-VHF160808H5N6ST_C1031.pdf; ComponentLink2Description: JLCPCB Part URL; ComponentLink2URL: https://jlcpcb.com/partdetail/C1031; ComponentLink3Description: LCSC Part URL; ComponentLink3URL: https://lcsc.com/product-detail/Inductors-SMD_FH-Guangdong-Fenghua-Advanced-Tech-FH-Guangdong-Fenghua-Advanced-Tech-VHF160808H5N6ST_C1031.html
footprint IND-0603 (0603 (1608M) Inductor)
pins: 1, 2

## VHF160808H6N2ST
designator L?  Inductance: 6.2nH
Inductor, 6.2nH, 400mA, SMD 0603; Manufacturer: FH (Guangdong Fenghua Advanced Tech); Manufacturer Part Number: VHF160808H6N2ST; Package Size: 0603; JLCPCB Basic Part: No; JLCPCB Part Number: C395091; Supplier 1: LCSC; Category: Inductors; Supplier Part Number 1: C395091; Rated Current: 400mA; RoHS: Yes; ComponentLink1Description: Datasheet; ComponentLink1URL: https://wmsc.lcsc.com/wmsc/upload/file/pdf/v2/lcsc/2302231208_FH--Guangdong-Fenghua-Advanced-Tech-VHF160808H6N2ST_C395091.pdf; ComponentLink2Description: JLCPCB Part URL; ComponentLink2URL: https://jlcpcb.com/partdetail/C395091; ComponentLink3Description: LCSC Part URL; ComponentLink3URL: https://lcsc.com/product-detail/Inductors-SMD_FH-Guangdong-Fenghua-Advanced-Tech-FH-Guangdong-Fenghua-Advanced-Tech-VHF160808H6N2ST_C395091.html
footprint IND-0603 (0603 (1608M) Inductor)
pins: 1, 2

## VHF160808H6N8JT
designator L?  Inductance: 6.8nH
Inductor, 6.8nH, 350mΩ, 400mA, SMD 0603; Manufacturer: FH(Guangdong Fenghua Advanced Tech); Manufacturer Part Number: VHF160808H6N8JT; Package Size: 0603; JLCPCB Basic Part: No; JLCPCB Part Number: C90203; Supplier 1: LCSC; Category: Inductors; Supplier Part Number 1: C90203; Rated Current: 400mA; DC Resistance: 350mΩ; RoHS: Yes; ComponentLink1Description: Datasheet; ComponentLink1URL: https://wmsc.lcsc.com/wmsc/upload/file/pdf/v2/lcsc/2302231230_FH--Guangdong-Fenghua-Advanced-Tech-VHF160808H6N8JT_C90203.pdf; ComponentLink2Description: JLCPCB Part URL; ComponentLink2URL: https://jlcpcb.com/partdetail/C90203; ComponentLink3Description: LCSC Part URL; ComponentLink3URL: https://lcsc.com/product-detail/Inductors-SMD_FH-Guangdong-Fenghua-Advanced-Tech-FH-Guangdong-Fenghua-Advanced-Tech-VHF160808H6N8JT_C90203.html
footprint IND-0603 (0603 (1608M) Inductor)
pins: 1, 2

## VHF160808H7N5JT
designator L?  Inductance: 7.5nH
Inductor, 7.5nH, ±5%, 350mΩ, 500mA, SMD 0603; Manufacturer: FH(Guangdong Fenghua Advanced Tech); Manufacturer Part Number: VHF160808H7N5JT; Package Size: 0603; JLCPCB Basic Part: No; JLCPCB Part Number: C395093; Supplier 1: LCSC; Category: Inductors; Supplier Part Number 1: C395093; Tolerance: ±5%; Rated Current: 500mA; DC Resistance: 350mΩ; RoHS: Yes; ComponentLink1Description: Datasheet; ComponentLink1URL: https://wmsc.lcsc.com/wmsc/upload/file/pdf/v2/lcsc/2302231208_FH--Guangdong-Fenghua-Advanced-Tech-VHF160808H7N5JT_C395093.pdf; ComponentLink2Description: JLCPCB Part URL; ComponentLink2URL: https://jlcpcb.com/partdetail/C395093; ComponentLink3Description: LCSC Part URL; ComponentLink3URL: https://lcsc.com/product-detail/Inductors-SMD_FH-Guangdong-Fenghua-Advanced-Tech-FH-Guangdong-Fenghua-Advanced-Tech-VHF160808H7N5JT_C395093.html
footprint IND-0603 (0603 (1608M) Inductor)
pins: 1, 2

## VHF160808H8N2JT
designator L?  Inductance: 8.2nH
Inductor, 8.2nH, ±5%, 350mΩ, 400mA, SMD 0603; Manufacturer: FH(Guangdong Fenghua Advanced Tech); Manufacturer Part Number: VHF160808H8N2JT; Package Size: 0603; JLCPCB Basic Part: No; JLCPCB Part Number: C90204; Supplier 1: LCSC; Category: Inductors; Supplier Part Number 1: C90204; Tolerance: ±5%; Rated Current: 400mA; DC Resistance: 350mΩ; RoHS: Yes; ComponentLink1Description: Datasheet; ComponentLink1URL: https://wmsc.lcsc.com/wmsc/upload/file/pdf/v2/lcsc/2302231230_FH--Guangdong-Fenghua-Advanced-Tech-VHF160808H8N2JT_C90204.pdf; ComponentLink2Description: JLCPCB Part URL; ComponentLink2URL: https://jlcpcb.com/partdetail/C90204; ComponentLink3Description: LCSC Part URL; ComponentLink3URL: https://lcsc.com/product-detail/Inductors-SMD_FH-Guangdong-Fenghua-Advanced-Tech-FH-Guangdong-Fenghua-Advanced-Tech-VHF160808H8N2JT_C90204.html
footprint IND-0603 (0603 (1608M) Inductor)
pins: 1, 2
